# Altium footprint library pre_CONNECTOR.PcbLib: 64 footprints (part 2 of 4)
Each footprint in its own frame and in the unit in brackets; x right, y up, seen from the top. Pads: shape width x height; smd on the part's side, far side on the other; paste and mask are expansions set on the pad; w line width, h text height; cw(c..) or ccw(c..) is an arc to the next point about the centre after c.
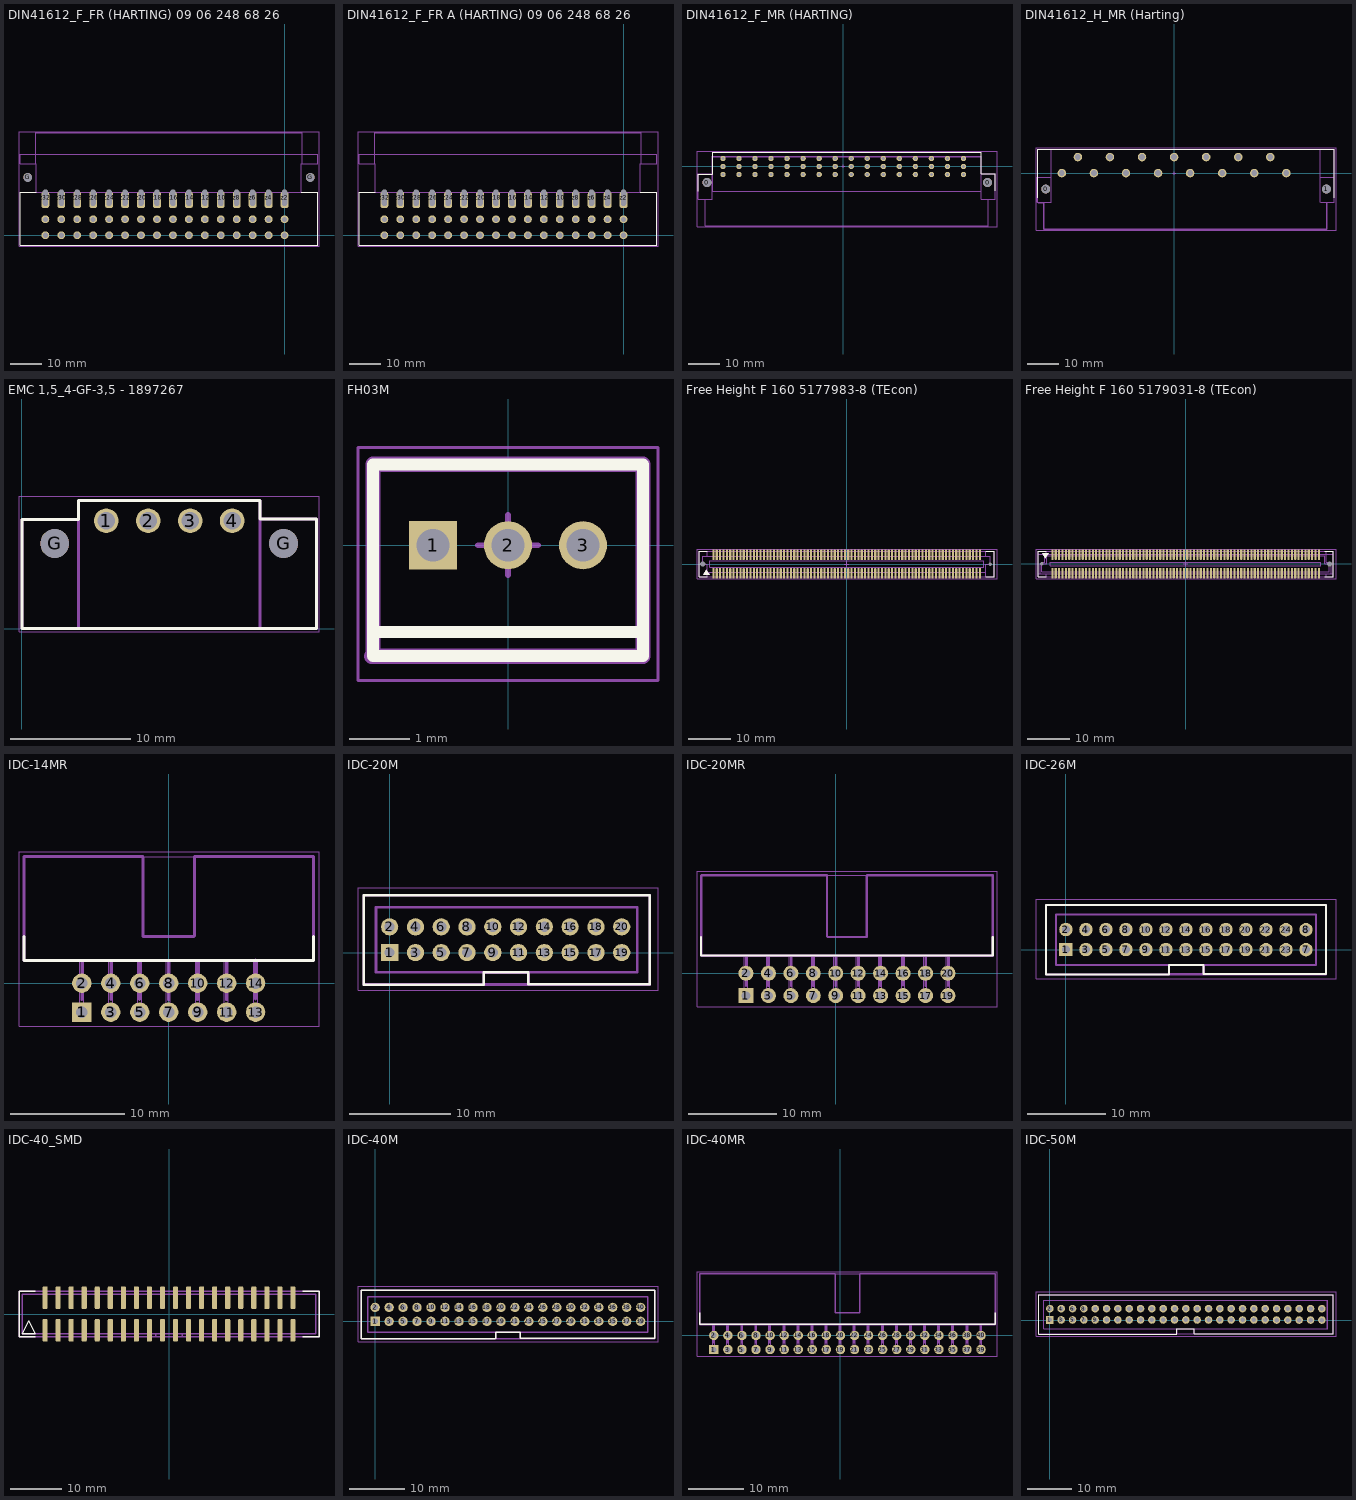
[diagram p1: the footprints below, top view; thin cyan lines are the x and y axes]

## DIN41612_F_FR (HARTING) 09 06 248 68 26 [mm] "Розетка Harting 41612 Тип F"
height 12.7
pads (50):
  round 2.5 hole 1.6: b2(0,5.08) b4(-5.08,5.08) b6(-10.16,5.08) b8(-15.24,5.08) b10(-20.32,5.08) b12(-25.4,5.08) b14(-30.48,5.08) b16(-35.56,5.08) b18(-40.64,5.08) b20(-45.72,5.08) b22(-50.8,5.08) b24(-55.88,5.08) b26(-60.96,5.08) b28(-66.04,5.08) b30(-71.12,5.08) b32(-76.2,5.08) d2(0,0) d4(-5.08,0) d6(-10.16,0) d8(-15.24,0) d10(-20.32,0) d12(-25.4,0) d14(-30.48,0) d16(-35.56,0) d18(-40.64,0) d20(-45.72,0) d22(-50.8,0) d24(-55.88,0) d26(-60.96,0) d28(-66.04,0) d30(-71.12,0) d32(-76.2,0)
  round 2.8 hole 2.8: G(-81.83,18.43) G(8.17,18.43)
  rrect50% 2.5x5.1 hole 1.6 slot 5.17 at 90 deg copper offset 0,-0.7: z2(0,11.945) z4(-5.08,11.945) z6(-10.16,11.945) z8(-15.24,11.945) z10(-20.32,11.945) z12(-25.4,11.945) z14(-30.48,11.945) z16(-35.56,11.945) z18(-40.64,11.945) z20(-45.72,11.945) z22(-50.8,11.945) z24(-55.88,11.945) z26(-60.96,11.945) z28(-66.04,11.945) z30(-71.12,11.945) z32(-76.2,11.945)
Top Overlay:
  lines w0.254: -79.135,13.73 -84.235,13.73 -84.235,-3.145 10.565,-3.145 ; 5.365,13.73 10.565,13.73 10.565,-3.145 ; 10.565,-3.145 10.565,-3.145
Top Assy:
  lines w0.254: -79.28,22.83 -79.28,32.63 5.62,32.63 5.62,22.73 ; -79.28,25.73 -84.23,25.73 -84.23,22.73 -79.38,22.73 -79.13,22.73 -79.13,13.73 5.37,13.73 5.37,22.73 5.62,22.73 ; 5.62,22.73 10.57,22.73 10.57,25.73 5.62,25.73 5.62,22.73
Mechanical 13:
  lines w0.254: -84.231,25.605 -84.231,22.715 -79.132,22.715 -79.132,13.729 5.375,13.729 5.375,22.73 5.62,22.73 ; -84.231,25.73 -79.284,25.73 ; -79.284,22.729 -79.284,25.729 ; -79.28,25.73 5.62,25.73 ; -79.28,25.766 -79.28,32.629 5.62,32.629 5.62,22.73 ; 5.62,23.06 5.62,25.73 ; 5.62,22.73 10.57,22.73 10.57,25.73 5.62,25.73
Mechanical 15:
  lines w0.05: -84.585,-3.52 10.965,-3.52 ; -84.58,-3.52 -84.58,32.98 10.965,32.98 10.965,-3.495
  lines w0.1: -0.5,0.014 0.5,0.014 ; 0,-0.486 0,0.514
3D body: height 14.75, standoff 0, extent -79.138,13.719 5.406,22.743
3D body: height 14.75, standoff 0, extent 5.631,22.701 10.576,25.724
3D body: height 13.57, standoff 1.17, extent -79.135,25.73 5.628,32.505
3D body: height 14.75, standoff 0, extent -84.126,22.713 -79.286,25.725
3D body: height 14.75, standoff 0, extent -79.289,22.745 5.601,25.73

## DIN41612_F_FR A (HARTING) 09 06 248 68 26 [mm] "Розетка Harting 41612 Тип F"
height 12.7
pads (48):
  round 2.5 hole 1.6: b2(-0.009,5.071) b4(-5.089,5.071) b6(-10.169,5.071) b8(-15.249,5.071) b10(-20.329,5.071) b12(-25.409,5.071) b14(-30.489,5.071) b16(-35.569,5.071) b18(-40.649,5.071) b20(-45.729,5.071) b22(-50.809,5.071) b24(-55.889,5.071) b26(-60.969,5.071) b28(-66.049,5.071) b30(-71.129,5.071) b32(-76.209,5.071) d2(-0.009,-0.009) d4(-5.089,-0.009) d6(-10.169,-0.009) d8(-15.249,-0.009) d10(-20.329,-0.009) d12(-25.409,-0.009) d14(-30.489,-0.009) d16(-35.569,-0.009) d18(-40.649,-0.009) d20(-45.729,-0.009) d22(-50.809,-0.009) d24(-55.889,-0.009) d26(-60.969,-0.009) d28(-66.049,-0.009) d30(-71.129,-0.009) d32(-76.209,-0.009)
  rrect50% 2.5x5.1 hole 1.6 slot 5.17 at 90 deg copper offset 0,-0.7: z2(-0.009,11.936) z4(-5.089,11.936) z6(-10.169,11.936) z8(-15.249,11.936) z10(-20.329,11.936) z12(-25.409,11.936) z14(-30.489,11.936) z16(-35.569,11.936) z18(-40.649,11.936) z20(-45.729,11.936) z22(-50.809,11.936) z24(-55.889,11.936) z26(-60.969,11.936) z28(-66.049,11.936) z30(-71.129,11.936) z32(-76.209,11.936)
Top Overlay:
  lines w0.254: -79.144,13.721 -84.244,13.721 -84.244,-3.154 10.556,-3.154 ; 5.356,13.721 10.556,13.721 10.556,-3.154 ; 10.556,-3.154 10.556,-3.154
Top Assy:
  lines w0.254: -79.289,22.821 -79.289,32.621 5.611,32.621 5.611,22.721 ; -79.289,25.721 -84.239,25.721 -84.239,22.721 -79.389,22.721 -79.139,22.721 -79.139,13.721 5.361,13.721 5.361,22.721 5.611,22.721 ; 5.611,22.721 5.611,25.721 10.561,25.721 10.561,22.721 5.611,22.721
Mechanical 13:
  lines w0.254: -84.24,25.596 -84.24,22.706 -79.141,22.706 -79.141,13.72 5.366,13.72 5.366,22.721 5.611,22.721 ; -84.24,25.721 -79.293,25.721 ; -79.293,22.721 -79.293,25.72 ; -79.289,25.721 5.611,25.721 ; -79.289,25.757 -79.289,32.62 5.611,32.62 5.611,22.721 ; 5.611,23.051 5.611,25.721 ; 5.611,22.721 10.561,22.721 10.561,25.721 5.611,25.721
Mechanical 15:
  lines w0.05: -84.594,-3.529 10.956,-3.529 ; -84.589,-3.529 -84.589,32.971 10.956,32.971 10.956,-3.504
  lines w0.1: -0.509,0.005 0.491,0.005 ; -0.009,-0.495 -0.009,0.505
3D body: height 14.75, standoff 0, extent -79.298,22.736 5.592,25.721
3D body: height 14.75, standoff 0, extent -84.135,22.704 -79.295,25.716
3D body: height 13.57, standoff 1.17, extent -79.144,25.721 5.619,32.496
3D body: height 14.75, standoff 0, extent 5.622,22.692 10.567,25.715
3D body: height 14.75, standoff 0, extent -79.147,13.71 5.397,22.734

## DIN41612_F_MR (HARTING) [mm]
height 12.7
pads (50):
  round 2.8 hole 2.8 unplated: 0(-43.18,-5.08) 0(45.72,-5.08)
  round 1.7 hole 1: b2(38.1,0) b4(33.02,0) b6(27.94,0) b8(22.86,0) b10(17.78,0) b12(12.7,0) b14(7.62,0) b16(2.54,0) b18(-2.54,0) b20(-7.62,0) b22(-12.7,0) b24(-17.78,0) b26(-22.86,0) b28(-27.94,0) b30(-33.02,0) b32(-38.1,0) d2(38.1,2.54) d4(33.02,2.54) d6(27.94,2.54) d8(22.86,2.54) d10(17.78,2.54) d12(12.7,2.54) d14(7.62,2.54) d16(2.54,2.54) d18(-2.54,2.54) d20(-7.62,2.54) d22(-12.7,2.54) d24(-17.78,2.54) d26(-22.86,2.54) d28(-27.94,2.54) d30(-33.02,2.54) d32(-38.1,2.54) z2(38.1,-2.54) z4(33.02,-2.54) z6(27.94,-2.54) z8(22.86,-2.54) z10(17.78,-2.54) z12(12.7,-2.54) z14(7.62,-2.54) z16(2.54,-2.54) z18(-2.54,-2.54) z20(-7.62,-2.54) z22(-12.7,-2.54) z24(-17.78,-2.54) z26(-22.86,-2.54) z28(-27.94,-2.54) z30(-33.02,-2.54) z32(-38.1,-2.54)
Top Overlay:
  lines w0.254: -45.9,-7.8 -45.9,-2.4 -41.425,-2.4 ; -41.375,-2.4 -41.375,4.5 ; -41.35,4.5 -31.7,4.5 43.725,4.5 ; 43.725,-2.3 48.075,-2.3 ; 43.725,-2.275 43.725,4.475 ; 48.2,-7.7 48.2,-2.325
Top Assy:
  lines w0.254: -43.75,-10.45 -43.75,-18.78 43.75,-18.78 45.92,-18.78 45.92,-10.42 45.9,-10.4 ; -41.5,-7.94 -41.5,-10.4 -45.9,-10.4 -45.9,-2.4 -41.4,-2.4 ; 43.765,-2.3 48.2,-2.3 48.2,-10.4 43.8,-10.4 43.8,-9.775 43.8,-8.525 43.8,-7.9 ; -41.4,-7.84 42.1,-7.84 43.74,-7.84 43.75,-7.85 43.75,3.22 -41.4,3.22 -41.4,-7.84
Mechanical 13:
  lines w0.1: -45.9,-10.363 -45.9,-2.375 -41.487,-2.375 ; -45.888,-10.375 -43.713,-10.375 ; -43.725,-10.425 -43.725,-18.775 45.875,-18.775 45.875,-10.375 ; -43.7,-10.375 -41.525,-10.375 ; -41.45,-10.375 -41.45,3.2 ; -41.45,3.15 43.775,3.15 ; 43.75,-10.375 43.75,3.2 ; 43.787,-2.375 48.2,-2.375 48.2,-10.363 ; 43.825,-10.375 46,-10.375 ; 46.013,-10.375 48.188,-10.375
Mechanical 15:
  lines w0.05: -46.325,-19.15 -46.325,4.875 48.725,4.875 48.725,-19.15 -46.325,-19.15
  lines w0.1: -0.5,0.025 0.5,0.025 ; 0,-0.475 0,0.525
3D body: height 9.7, standoff 0, extent -41.4,-7.75 43.731,3.2
3D body: height 6, standoff 0, extent 43.794,-10.4 48.256,-2.4
3D body: height 6, standoff 0, extent -45.9,-10.375 -41.438,-2.375
3D body: height 9.7, standoff -3, extent -43.725,-18.775 45.875,-7.725

## DIN41612_H_MR (Harting) [mm]
height 14.8
pads (17):
  round 2.8 hole 2.8: 0(-40.64,-5.08) 1(48.26,-5.08)
  round 2.7 hole 1.8: d6(30.48,5.08) d10(20.32,5.08) d14(10.16,5.08) d18(0,5.08) d22(-10.16,5.08) d26(-20.32,5.08) d30(-30.48,5.08) z4(35.56,0) z8(25.4,0) z12(15.24,0) z16(5.08,0) z20(-5.08,0) z24(-15.24,0) z28(-25.4,0) z32(-35.56,0)
Top Overlay:
  lines w0.254: -43.18,-7.84 -43.18,7.62 50.8,7.62 50.8,-7.84
Top Assy:
  lines w0.254: -43.18,-9.27 -43.18,-7.84 -43.18,7.62 50.8,7.62 50.8,-9.305 48.42,-9.305 48.42,-17.78 -41.22,-17.78 -41.22,-9.375 -43.075,-9.375 -43.18,-9.27
Mechanical 13:
  lines w0.1: -43.325,-9.288 -43.325,-1.3 -38.912,-1.3 ; -43.312,-9.3 -41.137,-9.3 ; -41.15,-9.35 -41.15,-17.7 48.45,-17.7 48.45,-9.3 ; -41.125,-9.3 -38.95,-9.3 ; -38.875,-9.3 -38.875,7.6 46.325,7.6 46.325,-9.3 ; 46.363,-1.3 50.775,-1.3 50.775,-9.288 ; 46.4,-9.3 48.575,-9.3 ; 48.588,-9.3 50.763,-9.3
Mechanical 15:
  lines w0.05: -43.75,-18.075 51.3,-18.075 51.3,7.975 -43.75,7.975 -43.75,-18.075
  lines w0.1: -0.475,0 0.525,0 ; 0.025,-0.525 0.025,0.475
3D body: height 9.7, standoff -3, extent -41.15,-17.7 48.45,-6.65
3D body: height 6, standoff 0, extent -43.325,-9.3 -38.863,-1.3
3D body: height 6, standoff 0, extent 46.369,-9.325 50.831,-1.325
3D body: height 9.7, standoff 0, extent -38.825,-6.675 46.306,7.625

## EMC 1,5_4-GF-3,5 - 1897267 [mm] "Клемма Base strip - EMC 1,5_4-GF-3,5 - 1897267 Phoenix Contact"
height 7
pads (6):
  round 2.05 hole 1.45: 1(7.025,9) 2(10.525,9) 3(14.025,9) 4(17.525,9)
  round 2.4 hole 2.4: G(2.725,7.1) G(21.825,7.1)
Top Overlay:
  lines w0.254: 0,0 0,9.1 4.7,9.1 4.7,10.7 19.85,10.7 19.85,9.125 24.55,9.125 24.55,0 0,0
Top Assy:
  lines w0.254: 0,9.075 0,0 24.55,0 24.55,9.125 19.875,9.125 19.85,9.15 19.85,10.7 4.7,10.7 4.7,9.1 0,9.1
Mechanical 13:
  lines w0.254: 4.7,0 19.85,0 ; 4.7,0 4.7,10.7 19.85,10.7 19.85,0 ; 4.7,0 0,0 0,9.1 4.7,9.1 4.7,0 ; 19.85,0 19.85,9.125 24.55,9.125 24.55,0 19.85,0
Mechanical 15:
  lines w0.05: -0.25,-0.25 24.775,-0.25 24.775,11.025 -0.25,11.025 -0.25,-0.25
  lines w0.1: 6.525,9 7.525,9 ; 7.025,8.5 7.025,9.5
3D body: height 6, standoff 0, extent 19.8,0 24.556,9.125
3D body: height 6, standoff 0, extent 0,0 4.753,9
3D body: height 7, standoff 0, extent 4.7,0 19.857,10.7

## FH03M [mm]
pads (3):
  rect 0.8x0.8 hole 0.55: 1(-1.25,0)
  round 0.8 hole 0.55: 2(0,0) 3(1.25,0)
Top Overlay:
  lines w0.2: -2.25,-1.45 2.25,-1.45 ; -2.25,-1.85 2.25,-1.85 2.25,1.35 -2.25,1.35 -2.25,-1.85
Top Assy:
  lines w0.254: -2.275,-1.85 2.25,-1.85 2.25,1.35 -2.25,1.35 -2.25,-1.85
Mechanical 13:
  lines w0.1: -2.25,-1.85 2.25,-1.85 2.25,1.35 -2.25,1.35 -2.25,-1.85
Mechanical 15:
  lines w0.05: -2.5,-2.25 -2.5,1.625 2.5,1.625 2.5,-2.25 -2.5,-2.25
  lines w0.1: -0.5,0 0.5,0 ; 0,-0.5 0,0.5
3D body: height 4.2, standoff 0, extent -2.325,-1.9 2.3,1.4

## Free Height F 160 5177983-8 (TEcon) [mm]
height 3.75
pads (162):
  round 0 hole 1.23 unplated mask+0.7: 0(-34.1,0)
  round 0 hole 0.83 unplated mask+0.5: 0(34.1,0)
  rect 0.5x2.5 smd: 1(-31.6,-2.2)
  rrect50% 0.5x2.5 smd: 2(-31.6,2.2) 3(-30.8,-2.2) 4(-30.8,2.2) 5(-30,-2.2) 6(-30,2.2) 7(-29.2,-2.2) 8(-29.2,2.2) 9(-28.4,-2.2) 10(-28.4,2.2) 11(-27.6,-2.2) 12(-27.6,2.2) 13(-26.8,-2.2) 14(-26.8,2.2) 15(-26,-2.2) 16(-26,2.2) 17(-25.2,-2.2) 18(-25.2,2.2) 19(-24.4,-2.2) 20(-24.4,2.2) 21(-23.6,-2.2) 22(-23.6,2.2) 23(-22.8,-2.2) 24(-22.8,2.2) 25(-22,-2.2) 26(-22,2.2) 27(-21.2,-2.2) 28(-21.2,2.2) 29(-20.4,-2.2) 30(-20.4,2.2) 31(-19.6,-2.2) 32(-19.6,2.2) 33(-18.8,-2.2) 34(-18.8,2.2) 35(-18,-2.2) 36(-18,2.2) 37(-17.2,-2.2) 38(-17.2,2.2) 39(-16.4,-2.2) 40(-16.4,2.2) 41(-15.6,-2.2) 42(-15.6,2.2) 43(-14.8,-2.2) 44(-14.8,2.2) 45(-14,-2.2) 46(-14,2.2) 47(-13.2,-2.2) 48(-13.2,2.2) 49(-12.4,-2.2) 50(-12.4,2.2) 51(-11.6,-2.2) 52(-11.6,2.2) 53(-10.8,-2.2) 54(-10.8,2.2) 55(-10,-2.2) 56(-10,2.2) 57(-9.2,-2.2) 58(-9.2,2.2) 59(-8.4,-2.2) 60(-8.4,2.2) 61(-7.6,-2.2) 62(-7.6,2.2) 63(-6.8,-2.2) 64(-6.8,2.2) 65(-6,-2.2) 66(-6,2.2) 67(-5.2,-2.2) 68(-5.2,2.2) 69(-4.4,-2.2) 70(-4.4,2.2) 71(-3.6,-2.2) 72(-3.6,2.2) 73(-2.8,-2.2) 74(-2.8,2.2) 75(-2,-2.2) 76(-2,2.2) 77(-1.2,-2.2) 78(-1.2,2.2) 79(-0.4,-2.2) 80(-0.4,2.2) 81(0.4,-2.2) 82(0.4,2.2) 83(1.2,-2.2) 84(1.2,2.2) 85(2,-2.2) 86(2,2.2) 87(2.8,-2.2) 88(2.8,2.2) 89(3.6,-2.2) 90(3.6,2.2) 91(4.4,-2.2) 92(4.4,2.2) 93(5.2,-2.2) 94(5.2,2.2) 95(6,-2.2) 96(6,2.2) 97(6.8,-2.2) 98(6.8,2.2) 99(7.6,-2.2) 100(7.6,2.2) 101(8.4,-2.2) 102(8.4,2.2) 103(9.2,-2.2) 104(9.2,2.2) 105(10,-2.2) 106(10,2.2) 107(10.8,-2.2) 108(10.8,2.2) 109(11.6,-2.2) 110(11.6,2.2) 111(12.4,-2.2) 112(12.4,2.2) 113(13.2,-2.2) 114(13.2,2.2) 115(14,-2.2) 116(14,2.2) 117(14.8,-2.2) 118(14.8,2.2) 119(15.6,-2.2) 120(15.6,2.2) 121(16.4,-2.2) 122(16.4,2.2) 123(17.2,-2.2) 124(17.2,2.2) 125(18,-2.2) 126(18,2.2) 127(18.8,-2.2) 128(18.8,2.2) 129(19.6,-2.2) 130(19.6,2.2) 131(20.4,-2.2) 132(20.4,2.2) 133(21.2,-2.2) 134(21.2,2.2) 135(22,-2.2) 136(22,2.2) 137(22.8,-2.2) 138(22.8,2.2) 139(23.6,-2.2) 140(23.6,2.2) 141(24.4,-2.2) 142(24.4,2.2) 143(25.2,-2.2) 144(25.2,2.2) 145(26,-2.2) 146(26,2.2) 147(26.8,-2.2) 148(26.8,2.2) 149(27.6,-2.2) 150(27.6,2.2) 151(28.4,-2.2) 152(28.4,2.2) 153(29.2,-2.2) 154(29.2,2.2) 155(30,-2.2) 156(30,2.2) 157(30.8,-2.2) 158(30.8,2.2) 159(31.6,-2.2) 160(31.6,2.2)
Top Overlay:
  region: -34.05,-2.525 -32.45,-2.525 -33.25,-1.325
  lines w0.254: -33,-3 -35,-3 -35,3 -33,3 ; 32.988,-3 34.988,-3 ; 33,3 35,3 35,-2.975
Top Assy:
  region: -34.05,-2.525 -32.45,-2.525 -33.25,-1.325
  lines w0.254: -34.1,1.85 -34.1,0 -33,0 -33,-3 -35,-3 -35,3 -33,3 ; -34.1,1.9 34.1,1.9 ; -33,-1.9 33,-1.9 33,0 34.1,0 ; -33,1.9 -33,2.975 ; 33,-1.875 33,-3 34.975,-3 ; 33,1.9 33,3 35,3 35,-2.975 ; 34.1,-0.025 34.1,1.825 ; -32.5,-0.8 32.5,-0.8 32.5,0.8 -32.5,0.8 -32.5,-0.8
Mechanical 13:
  lines w0.2: -33,-3.025 -33,-1.9 ; -33,1.9 -33,3 ; 33,-3.025 33,-1.9 ; 33,1.9 33,3 ; -33,-1.9 -33,0 -34.1,0 -34.1,1.9 34.1,1.9 34.1,0 33,0 33,-1.9 ; -33,-1.9 33,-1.9 ; -35,-3 -35,3.025 35,3.025 35,-3 -35,-3 ; -32.5,-0.8 -32.5,0.8 32.5,0.8 32.5,-0.8 -32.5,-0.8
Mechanical 15:
  lines w0.05: -35.475,-3.525 -35.475,3.575 35.675,3.575 35.675,-3.525 -35.475,-3.525
  lines w0.1: -0.5,0 0.5,0 ; 0,-0.5 0,0.5
3D body: height 1.2, standoff 0, extent -35.05,-3.025 35,3
3D body: height 3.75, standoff 0, extent -34.1,-0.025 34.112,1.925
3D body: height 3.75, standoff 0, extent -33,-1.9 33.012,-0.025

## Free Height F 160 5179031-8 (TEcon) [mm]
height 7.6
pads (162):
  round 0 hole 0.83 unplated mask+0.5: 0(-34.1,0)
  round 0 hole 1.23 unplated mask+0.7: 0(34.1,0)
  rect 0.5x2.5 smd: 1(-31.6,2.2)
  rrect50% 0.5x2.5 smd: 2(-31.6,-2.2) 3(-30.8,2.2) 4(-30.8,-2.2) 5(-30,2.2) 6(-30,-2.2) 7(-29.2,2.2) 8(-29.2,-2.2) 9(-28.4,2.2) 10(-28.4,-2.2) 11(-27.6,2.2) 12(-27.6,-2.2) 13(-26.8,2.2) 14(-26.8,-2.2) 15(-26,2.2) 16(-26,-2.2) 17(-25.2,2.2) 18(-25.2,-2.2) 19(-24.4,2.2) 20(-24.4,-2.2) 21(-23.6,2.2) 22(-23.6,-2.2) 23(-22.8,2.2) 24(-22.8,-2.2) 25(-22,2.2) 26(-22,-2.2) 27(-21.2,2.2) 28(-21.2,-2.2) 29(-20.4,2.2) 30(-20.4,-2.2) 31(-19.6,2.2) 32(-19.6,-2.2) 33(-18.8,2.2) 34(-18.8,-2.2) 35(-18,2.2) 36(-18,-2.2) 37(-17.2,2.2) 38(-17.2,-2.2) 39(-16.4,2.2) 40(-16.4,-2.2) 41(-15.6,2.2) 42(-15.6,-2.2) 43(-14.8,2.2) 44(-14.8,-2.2) 45(-14,2.2) 46(-14,-2.2) 47(-13.2,2.2) 48(-13.2,-2.2) 49(-12.4,2.2) 50(-12.4,-2.2) 51(-11.6,2.2) 52(-11.6,-2.2) 53(-10.8,2.2) 54(-10.8,-2.2) 55(-10,2.2) 56(-10,-2.2) 57(-9.2,2.2) 58(-9.2,-2.2) 59(-8.4,2.2) 60(-8.4,-2.2) 61(-7.6,2.2) 62(-7.6,-2.2) 63(-6.8,2.2) 64(-6.8,-2.2) 65(-6,2.2) 66(-6,-2.2) 67(-5.2,2.2) 68(-5.2,-2.2) 69(-4.4,2.2) 70(-4.4,-2.2) 71(-3.6,2.2) 72(-3.6,-2.2) 73(-2.8,2.2) 74(-2.8,-2.2) 75(-2,2.2) 76(-2,-2.2) 77(-1.2,2.2) 78(-1.2,-2.2) 79(-0.4,2.2) 80(-0.4,-2.2) 81(0.4,2.2) 82(0.4,-2.2) 83(1.2,2.2) 84(1.2,-2.2) 85(2,2.2) 86(2,-2.2) 87(2.8,2.2) 88(2.8,-2.2) 89(3.6,2.2) 90(3.6,-2.2) 91(4.4,2.2) 92(4.4,-2.2) 93(5.2,2.2) 94(5.2,-2.2) 95(6,2.2) 96(6,-2.2) 97(6.8,2.2) 98(6.8,-2.2) 99(7.6,2.2) 100(7.6,-2.2) 101(8.4,2.2) 102(8.4,-2.2) 103(9.2,2.2) 104(9.2,-2.2) 105(10,2.2) 106(10,-2.2) 107(10.8,2.2) 108(10.8,-2.2) 109(11.6,2.2) 110(11.6,-2.2) 111(12.4,2.2) 112(12.4,-2.2) 113(13.2,2.2) 114(13.2,-2.2) 115(14,2.2) 116(14,-2.2) 117(14.8,2.2) 118(14.8,-2.2) 119(15.6,2.2) 120(15.6,-2.2) 121(16.4,2.2) 122(16.4,-2.2) 123(17.2,2.2) 124(17.2,-2.2) 125(18,2.2) 126(18,-2.2) 127(18.8,2.2) 128(18.8,-2.2) 129(19.6,2.2) 130(19.6,-2.2) 131(20.4,2.2) 132(20.4,-2.2) 133(21.2,2.2) 134(21.2,-2.2) 135(22,2.2) 136(22,-2.2) 137(22.8,2.2) 138(22.8,-2.2) 139(23.6,2.2) 140(23.6,-2.2) 141(24.4,2.2) 142(24.4,-2.2) 143(25.2,2.2) 144(25.2,-2.2) 145(26,2.2) 146(26,-2.2) 147(26.8,2.2) 148(26.8,-2.2) 149(27.6,2.2) 150(27.6,-2.2) 151(28.4,2.2) 152(28.4,-2.2) 153(29.2,2.2) 154(29.2,-2.2) 155(30,2.2) 156(30,-2.2) 157(30.8,2.2) 158(30.8,-2.2) 159(31.6,2.2) 160(31.6,-2.2)
Top Overlay:
  region: -34.05,2.525 -32.45,2.525 -33.25,1.325
  lines w0.254: -33,-3 -35,-3 -35,3 -33,3 ; 33,-3 35,-3 35,2.975 34.975,3 33,3
Top Assy:
  region: -34.05,2.525 -32.45,2.525 -33.25,1.325
  lines w0.254: -35,2.275 -33.025,2.275 -33.025,3 ; -34.975,-2.3 34.5,-2.3 34.5,0.025 ; -34.5,-2.3 -34.5,0 ; -34.1,0.4 -33.4,0.4 -33.4,2.3 ; -33.025,2.3 33.4,2.3 ; -33,-3 -35,-3 -35,3 -33,3 ; -33,-2.975 -33,-2.3 ; 33,-3 35,-3 35,2.975 ; 33,3 34.975,3 ; 33.3,2.3 34.975,2.3 ; 33.4,-3 33.4,-2.3 ; 33.4,1.875 33.4,3 ; 33.4,1.9 33.4,0.4 34.475,0.4 ; 33.475,-2.3 34.975,-2.3 ; 34.075,-1.9 -34.1,-1.9 -34.1,0 -32.975,0 -32.975,1.875 -32.95,1.9 33,1.9 33,0.025 34.1,0.025 ; 34.1,-1.9 34.1,0 ; -32.1,-0.4 32.1,-0.4 32.1,0.4 -32.1,0.4 -32.1,-0.4
Mechanical 13:
  lines w0.2: -35,-2.325 -34.5,-2.325 ; -35,2.3 -33.025,2.3 ; -34.5,0 -34.5,-2.325 ; -34.1,0.4 -33.4,0.4 -33.4,2.3 ; -33.025,3.025 -33.025,2.3 ; -33,-3 -33,-2.325 ; -32.975,0 -34.1,0 -34.1,-1.85 -34.075,-1.875 34.1,-1.875 34.1,0.025 33,0.025 33,1.9 -32.975,1.9 -32.975,0.025 ; 33.275,2.3 35.025,2.3 ; 33.4,-3 33.4,-2.325 ; 33.4,2.3 -33.025,2.3 ; 33.4,3.025 33.4,1.9 33.4,0.4 34.5,0.4 ; 34,-2.325 35,-2.325 ; 34.5,0 34.5,-2.325 -34.5,-2.325 ; -35,-3.025 -35,3 35,3 35,-3.025 -35,-3.025 ; -32.1,-0.4 -32.1,0.4 32.1,0.4 32.1,-0.4 -32.1,-0.4
Mechanical 15:
  lines w0.05: -35.475,-3.575 -35.475,3.525 35.675,3.525 35.675,-3.575 -35.475,-3.575
  lines w0.1: -0.5,0 0.5,0 ; 0,-0.5 0,0.5
3D body: height 4.6, standoff 0, extent -35,-3.037 35.05,2.988
3D body: height 7.6, standoff 0, extent -34.5,-2.325 34.525,2.35
3D body: height 6, standoff 0, extent -32.095,-0.4 32.077,0.4

## IDC-14MR [mm]
height 8.75
pads (14):
  rect 1.7x1.7 hole 1: 1(-7.62,-2.54)
  round 1.7 hole 1: 2(-7.62,0) 3(-5.08,-2.54) 4(-5.08,0) 5(-2.54,-2.54) 6(-2.54,0) 7(0,-2.54) 8(0,0) 9(2.54,-2.54) 10(2.54,0) 11(5.08,-2.54) 12(5.08,0) 13(7.62,-2.54) 14(7.62,0)
Top Overlay:
  lines w0.254: -12.7,4.1 -12.7,2 0,2 12.7,2 12.7,4.1
Top Assy:
  lines w0.254: -7.625,-1.425 -7.625,2 ; -5.075,-1.425 -5.075,1.95 ; -2.55,-1.425 -2.55,1.975 ; -0.025,-1.45 -0.025,1.975 ; 2.525,-1.45 2.525,1.925 ; 5.05,-1.45 5.05,1.95 ; 7.625,-1.4 7.625,2.025 ; -12.7,2 -12.7,11.075 -12.675,11.1 -2.275,11.1 -2.25,11.075 -2.25,4.1 2.225,4.1 2.25,4.125 2.25,11.1 12.7,11.1 12.7,2 -12.7,2
Mechanical 13:
  lines w0.1: -7.8,2.025 -7.8,-2.54 -7.45,-2.54 -7.45,2.025 ; -5.25,2.057 -5.25,-2.485 -4.9,-2.475 -4.9,2.057 ; -2.725,-2.508 -2.725,2.057 ; -2.72,-2.54 -2.37,-2.54 ; -2.375,-2.508 -2.375,2.057 ; -0.2,-2.508 -0.2,2.057 ; -0.18,-2.54 0.17,-2.54 ; 0.15,-2.508 0.15,2.057 ; 2.35,-2.533 2.35,2.033 ; 2.36,-2.54 2.71,-2.54 ; 2.7,-2.533 2.7,2.033 ; 4.875,-2.533 4.875,2.033 ; 5.225,-2.533 5.225,2.033 ; 7.44,-2.54 7.79,-2.54 ; 7.45,-2.533 7.45,2.033 ; 7.8,-2.533 7.8,2.033 ; -12.7,1.95 -12.7,11.1 12.675,11.1 12.675,1.95 -12.7,1.95 ; 4.9,-2.54 5.25,-2.54 4.9,-2.54
Mechanical 15:
  lines w0.05: -13.125,-3.775 13.175,-3.775 13.175,11.525 -13.125,11.525 -13.125,-3.775
  lines w0.1: -0.5,0 0.5,0 ; 0,-0.5 0,0.5
3D body: height 5.8, standoff 0, extent 7.424,-2.54 7.8,2.075
3D body: height 5.8, standoff 0, extent 4.849,-2.54 5.225,2.075
3D body: height 5.8, standoff 0, extent 2.324,-2.54 2.7,2.075
3D body: height 5.8, standoff 0, extent -0.226,-2.54 0.15,2.075
3D body: height 5.8, standoff 0, extent -2.751,-2.54 -2.375,2.075
3D body: height 5.8, standoff 0, extent -5.276,-2.54 -4.9,2.075
3D body: height 5.8, standoff 0, extent -7.826,-2.54 -7.45,2.075
3D body: height 9, standoff 0, extent -12.725,2.025 12.675,11.125

## IDC-20M [mm]
height 9.05
pads (20):
  rect 1.7x1.7 hole 1: 1(-0.01,0.01)
  round 1.7 hole 1: 2(-0.01,2.55) 3(2.53,0.01) 4(2.53,2.55) 5(5.07,0.01) 6(5.07,2.55) 7(7.61,0.01) 8(7.61,2.55) 9(10.15,0.01) 10(10.15,2.55) 11(12.69,0.01) 12(12.69,2.55) 13(15.23,0.01) 14(15.23,2.55) 15(17.77,0.01) 16(17.77,2.55) 17(20.31,0.01) 18(20.31,2.55) 19(22.85,0.01) 20(22.85,2.55)
Top Overlay:
  lines w0.254: -2.55,-3.15 9.275,-3.15 9.275,-1.925 13.65,-1.925 13.65,-3.1 25.6,-3.1 25.6,5.675 22.995,5.675 -2.55,5.675 -2.55,-3.15
Top Assy:
  lines w0.254: -2.55,-3.13 21.85,-3.13 ; -2.55,-3.125 -2.55,5.675 ; -2.55,5.67 25.6,5.67 25.6,-3.13 13.725,-3.13 ; 9.25,-1.93 -1.35,-1.93 -1.35,4.47 24.4,4.47 24.4,-1.93 13.65,-1.93 ; 9.25,-3.125 9.25,-1.95 13.7,-1.95 13.7,-3.125 9.25,-3.125
Mechanical 13:
  lines w0.1: -2.55,5.67 25.65,5.67 25.65,-3.125 -2.55,-3.125 -2.55,5.675 ; -2.55,5.7 25.625,5.7 ; 9.3,-3.2 9.3,-2 ; 13.65,-3.2 13.65,-2.025 ; -1.35,-1.95 24.45,-1.95 24.45,4.475 -1.35,4.475 -1.35,-1.95
Mechanical 15:
  lines w0.05: -3.125,-3.675 26.425,-3.675 26.425,6.375 -3.125,6.375 -3.125,-3.675
  lines w0.1: 9.65,2.55 10.65,2.55 ; 22.35,2.55 23.35,2.55
3D body: height 8.8, standoff 0.25, extent 13.6,-3.145 25.6,-1.895
3D body: height 8.8, standoff 0.25, extent 24.42,-2.981 25.67,5.72
3D body: height 8.8, standoff 0.25, extent -2.611,-3.081 -1.361,5.65
3D body: height 8.8, standoff 0.25, extent -2.531,-3.12 9.275,-1.87
3D body: height 8.8, standoff 0.25, extent -2.506,4.475 25.625,5.725
3D body: height 2.8, standoff 0, extent -2.556,-3.125 25.65,5.7

## IDC-20MR [mm]
height 8.75
pads (20):
  rect 1.7x1.7 hole 1: 1(-10.16,-2.54)
  round 1.7 hole 1: 2(-10.16,0) 3(-7.62,-2.54) 4(-7.62,0) 5(-5.08,-2.54) 6(-5.08,0) 7(-2.54,-2.54) 8(-2.54,0) 9(0,-2.54) 10(0,0) 11(2.54,-2.54) 12(2.54,0) 13(5.08,-2.54) 14(5.08,0) 15(7.62,-2.54) 16(7.62,0) 17(10.16,-2.54) 18(10.16,0) 19(12.7,-2.54) 20(12.7,0)
Top Overlay:
  lines w0.254: -15.24,4.1 -15.24,2 1.27,2 17.78,2 17.78,4.1
Top Assy:
  lines w0.254: -10.15,-1.425 -10.15,2 ; -7.625,-1.425 -7.625,2 ; -5.075,-1.425 -5.075,1.95 ; -2.55,-1.425 -2.55,1.975 ; -0.025,-1.45 -0.025,1.975 ; 2.525,-1.45 2.525,1.925 ; 5.05,-1.45 5.05,1.95 ; 7.625,-1.4 7.625,2.025 ; 10.15,-1.45 10.15,1.975 ; 12.7,-1.425 12.7,2 ; -15.225,2 17.775,2 17.775,11.1 3.525,11.1 3.5,11.075 3.5,4.1 -0.9,4.1 -0.975,4.175 -0.975,11.075 -1,11.1 -15.2,11.1 -15.225,11.075 -15.225,2
Mechanical 13:
  lines w0.1: -10.325,2.025 -10.325,-2.54 -9.975,-2.54 -9.975,2.025 ; -7.8,2.025 -7.8,-2.54 -7.45,-2.54 -7.45,2.025 ; -5.25,2.057 -5.25,-2.485 -4.9,-2.475 -4.9,2.057 ; -2.725,-2.508 -2.725,2.057 ; -2.72,-2.54 -2.37,-2.54 ; -2.375,-2.508 -2.375,2.057 ; -0.2,-2.508 -0.2,2.057 ; -0.18,-2.54 0.17,-2.54 ; 0.15,-2.508 0.15,2.057 ; 2.35,-2.533 2.35,2.033 ; 2.36,-2.54 2.71,-2.54 ; 2.7,-2.533 2.7,2.033 ; 4.875,-2.533 4.875,2.033 ; 4.9,-2.54 5.25,-2.54 ; 5.225,-2.533 5.225,2.033 ; 7.44,-2.54 7.79,-2.54 ; 7.45,-2.533 7.45,2.033 ; 7.8,-2.533 7.8,2.033 ; 9.975,2 9.975,-2.565 10.325,-2.565 10.325,2 ; 12.525,2.025 12.525,-2.54 12.875,-2.54 12.875,2.025 ; -15.2,1.95 17.8,1.95 17.8,11.1 -15.2,11.1 -15.2,1.95
Mechanical 15:
  lines w0.05: -15.7,-3.775 -15.7,11.525 18.25,11.525 18.25,-3.775 -15.7,-3.775
  lines w0.1: -0.5,0 0.5,0 ; 0,-0.5 0,0.5
3D body: height 9, standoff 0, extent -15.228,2.025 17.75,11.125
3D body: height 5.8, standoff 0, extent -7.826,-2.54 -7.45,2.075
3D body: height 5.8, standoff 0, extent -5.276,-2.54 -4.9,2.075
3D body: height 5.8, standoff 0, extent -2.751,-2.54 -2.375,2.075
3D body: height 5.8, standoff 0, extent -0.226,-2.54 0.15,2.075
3D body: height 5.8, standoff 0, extent 2.324,-2.54 2.7,2.075
3D body: height 5.8, standoff 0, extent 4.849,-2.54 5.225,2.075
3D body: height 5.8, standoff 0, extent 7.424,-2.54 7.8,2.075
3D body: height 5.8, standoff 0, extent -10.351,-2.54 -9.975,2.075
3D body: height 5.8, standoff 0, extent 9.949,-2.565 10.325,2.05
3D body: height 5.8, standoff 0, extent 12.499,-2.54 12.875,2.075

## IDC-26M [mm]
height 9.05
pads (26):
  rect 1.7x1.7 hole 1: 1(0,0)
  round 1.7 hole 1: 2(0,2.54) 3(2.54,0) 4(2.54,2.54) 5(5.08,0) 6(5.08,2.54) 7(7.62,0) 7(30.49,-0.01) 8(7.62,2.54) 8(30.49,2.53) 9(10.16,0) 10(10.16,2.54) 11(12.7,0) 12(12.7,2.54) 13(15.24,0) 14(15.24,2.54) 15(17.78,0) 16(17.78,2.54) 17(20.32,0) 18(20.32,2.54) 19(22.86,0) 20(22.86,2.54) 21(25.41,-0.01) 22(25.41,2.53) 23(27.95,-0.01) 24(27.95,2.53)
Top Overlay:
  lines w0.254: -2.53,-3.16 -2.53,5.665 26.815,5.665 33.03,5.665 33.03,-3.11 17.47,-3.11 17.47,-1.935 13.095,-1.935 13.095,-3.16 -2.53,-3.16
Top Assy:
  lines w0.254: 13.07,-1.94 -1.26,-1.94 -1.26,4.46 31.76,4.46 31.76,-1.94 17.47,-1.94 ; 17.545,-3.14 33.03,-3.14 33.03,5.66 -2.53,5.66 -2.53,-3.14 25.67,-3.14 ; 13.07,-3.135 17.52,-3.135 17.52,-1.96 13.07,-1.96 13.07,-3.135
Mechanical 13:
  lines w0.1: 1.27,5.69 29.445,5.69 ; 13.12,-3.21 13.12,-2.01 ; 17.47,-3.21 17.47,-2.035 ; -2.53,-3.135 33.03,-3.135 33.03,5.66 -2.53,5.66 -2.53,-3.135 ; -2.5,-3.125 -2.5,5.6 33.025,5.6 33.025,-3.125 -2.5,-3.125
Mechanical 15:
  lines w0.05: -3.8,-3.685 -3.8,6.365 34.3,6.365 34.3,-3.685 -3.8,-3.685
3D body: height 2.8, standoff 0.1, extent -2.5,-3.125 33.025,5.655
3D body: height 8.8, standoff 0.1, extent -2.53,-3.125 -1.275,5.66
3D body: height 8.8, standoff 0.1, extent -2.53,-3.21 13.12,-2
3D body: height 8.8, standoff 0.1, extent 17.47,-3.135 33.03,-2.025
3D body: height 8.8, standoff 0.1, extent 31.75,-3.135 33,5.66
3D body: height 8.8, standoff 0.1, extent -2.5,4.5 33.025,5.6

## IDC-40_SMD [mm]
pads (40):
  rrect50% 1x4.4 smd: 1(-24.13,-3.175) 2(-24.13,3.175) 3(-21.59,-3.175) 4(-21.59,3.175) 5(-19.05,-3.175) 6(-19.05,3.175) 7(-16.51,-3.175) 8(-16.51,3.175) 9(-13.97,-3.175) 10(-13.97,3.175) 11(-11.43,-3.175) 12(-11.43,3.175) 13(-8.89,-3.175) 14(-8.89,3.175) 15(-6.35,-3.175) 16(-6.35,3.175) 17(-3.81,-3.175) 18(-3.81,3.175) 19(-1.27,-3.175) 20(-1.27,3.175) 21(1.27,-3.175) 22(1.27,3.175) 23(3.81,-3.175) 24(3.81,3.175) 25(6.35,-3.175) 26(6.35,3.175) 27(8.89,-3.175) 28(8.89,3.175) 29(11.43,-3.175) 30(11.43,3.175) 31(13.97,-3.175) 32(13.97,3.175) 33(16.51,-3.175) 34(16.51,3.175) 35(19.05,-3.175) 36(19.05,3.175) 37(21.59,-3.175) 38(21.59,3.175) 39(24.13,-3.175) 40(24.13,3.175)
Top Overlay:
  lines w0.254: -26.035,-4.445 -29.21,-4.445 -29.21,4.445 -26.035,4.445 ; 26.035,-4.445 29.21,-4.445 29.21,4.445 26.035,4.445 ; -28.575,-3.81 -26.035,-3.81 -27.305,-1.27 -28.575,-3.81
Top Assy:
  lines w0.254: -2.54,-4.445 -2.54,-3.81 ; 2.54,-4.445 2.54,-3.81 ; -29.21,-4.445 29.21,-4.445 29.21,4.445 -29.21,4.445 -29.21,-4.445 ; -28.575,-3.81 28.575,-3.81 28.575,3.81 -28.575,3.81 -28.575,-3.81
3D body: height 10.2, standoff 1.6, extent -29.21,-4.445 29.21,4.445

## IDC-40M [mm]
height 9.05
pads (40):
  rect 1.7x1.7 hole 1: 1(-0.01,0.01)
  round 1.7 hole 1: 2(-0.01,2.55) 3(2.53,0.01) 4(2.53,2.55) 5(5.07,0.01) 6(5.07,2.55) 7(7.61,0.01) 8(7.61,2.55) 9(10.15,0.01) 10(10.15,2.55) 11(12.69,0.01) 12(12.69,2.55) 13(15.23,0.01) 14(15.23,2.55) 15(17.77,0.01) 16(17.77,2.55) 17(20.31,0.01) 18(20.31,2.55) 19(22.85,0.01) 20(22.85,2.55) 21(25.39,0.01) 22(25.39,2.55) 23(27.93,0.01) 24(27.93,2.55) 25(30.47,0.01) 26(30.47,2.55) 27(33.01,0.01) 28(33.01,2.55) 29(35.55,0.01) 30(35.55,2.55) 31(38.09,0.01) 32(38.09,2.55) 33(40.63,0.01) 34(40.63,2.55) 35(43.17,0.01) 36(43.17,2.55) 37(45.71,0.01) 38(45.71,2.55) 39(48.25,0.01) 40(48.25,2.55)
Top Overlay:
  lines w0.254: 21.85,-3.15 -2.55,-3.15 -2.55,5.675 22.995,5.675 50.775,5.675 50.775,-3.1 26.35,-3.1 26.35,-1.925 ; 21.875,-3.15 21.875,-1.95 ; 21.875,-1.925 26.325,-1.925
Top Assy:
  lines w0.254: -2.55,-3.13 21.85,-3.13 ; -2.55,-3.125 -2.55,5.675 ; -2.55,5.67 50.755,5.67 50.775,5.65 50.775,-3.125 ; 21.9,-1.93 -1.35,-1.93 -1.35,4.47 49.5,4.47 49.5,-1.93 26.45,-1.93 ; 26.325,-1.95 21.85,-1.95 21.875,-1.975 21.875,-3.125 26.35,-3.125 26.35,-1.95 26.375,-1.925 ; 26.375,-3.13 50.775,-3.13
Mechanical 13:
  lines w0.1: -2.55,5.67 50.8,5.67 ; -2.55,5.675 -2.55,-3.125 50.8,-3.125 50.8,5.65 ; -2.55,5.7 50.8,5.7 ; 21.875,-3.125 21.875,-1.925 ; 26.325,-3.075 26.325,-1.9 ; -1.35,-1.95 -1.35,4.475 49.5,4.475 49.5,-1.95 -1.35,-1.95
Mechanical 15:
  lines w0.05: -3.125,-3.675 -3.125,6.375 51.4,6.375 51.4,-3.675 -3.125,-3.675
  lines w0.1: 9.65,2.55 10.65,2.55 ; 22.35,2.55 23.35,2.55 ; 37.59,2.55 38.59,2.55
3D body: height 2.8, standoff 0, extent -2.556,-3.125 50.775,5.7
3D body: height 8.8, standoff 0.25, extent -2.506,4.475 50.825,5.725
3D body: height 8.8, standoff 0.25, extent -2.531,-3.12 21.9,-1.87
3D body: height 8.8, standoff 0.25, extent -2.611,-3.081 -1.361,5.65
3D body: height 8.8, standoff 0.25, extent 49.52,-3.031 50.77,5.67
3D body: height 8.8, standoff 0.25, extent 26.294,-3.145 50.725,-1.895

## IDC-40MR [mm]
height 8.75
pads (40):
  rect 1.7x1.7 hole 1: 1(-22.86,-2.54)
  round 1.7 hole 1: 2(-22.86,0) 3(-20.32,-2.54) 4(-20.32,0) 5(-17.78,-2.54) 6(-17.78,0) 7(-15.24,-2.54) 8(-15.24,0) 9(-12.7,-2.54) 10(-12.7,0) 11(-10.16,-2.54) 12(-10.16,0) 13(-7.62,-2.54) 14(-7.62,0) 15(-5.08,-2.54) 16(-5.08,0) 17(-2.54,-2.54) 18(-2.54,0) 19(0,-2.54) 20(0,0) 21(2.54,-2.54) 22(2.54,0) 23(5.08,-2.54) 24(5.08,0) 25(7.62,-2.54) 26(7.62,0) 27(10.16,-2.54) 28(10.16,0) 29(12.7,-2.54) 30(12.7,0) 31(15.24,-2.54) 32(15.24,0) 33(17.78,-2.54) 34(17.78,0) 35(20.32,-2.54) 36(20.32,0) 37(22.86,-2.54) 38(22.86,0) 39(25.4,-2.54) 40(25.4,0)
Top Overlay:
  lines w0.254: -25.4,4.1 -25.4,2 1.27,2 27.925,2 27.925,4.1
Top Assy:
  lines w0.254: -22.865,-1.425 -22.865,2 ; -20.325,-1.425 -20.325,2 ; -17.775,-1.425 -17.775,1.95 ; -15.25,-1.425 -15.25,1.975 ; -12.725,-1.45 -12.725,1.975 ; -10.175,-1.45 -10.175,1.925 ; -7.625,-1.425 -7.625,2 ; -5.075,-1.425 -5.075,1.95 ; -2.55,-1.425 -2.55,1.975 ; -0.025,-1.45 -0.025,1.975 ; 2.525,-1.45 2.525,1.925 ; 5.05,-1.45 5.05,1.95 ; 7.625,-1.4 7.625,2.025 ; 10.15,-1.45 10.15,1.975 ; 12.69,-1.425 12.69,1.975 ; 15.215,-1.45 15.215,1.975 ; 17.765,-1.45 17.765,1.925 ; 20.29,-1.45 20.29,1.95 ; 22.865,-1.4 22.865,2.025 ; 25.39,-1.45 25.39,1.975 ; -25.4,2 27.925,2 27.925,11.1 3.525,11.1 3.5,11.075 3.5,4.1 -0.9,4.1 -0.975,4.175 -0.975,11.075 -1,11.1 -25.4,11.1 -25.4,2
Mechanical 13:
  lines w0.1: -23.04,2.025 -23.04,-2.54 -22.69,-2.54 -22.69,2.025 ; -23.025,2.025 -23.025,-2.54 -22.675,-2.54 -22.675,2.025 ; -20.5,2.025 -20.5,-2.54 -20.15,-2.54 -20.15,2.025 ; -17.95,2.057 -17.95,-2.485 -17.6,-2.475 -17.6,2.057 ; -15.425,-2.508 -15.425,2.057 ; -15.42,-2.54 -15.07,-2.54 ; -15.075,-2.508 -15.075,2.057 ; -12.9,-2.508 -12.9,2.057 ; -12.88,-2.54 -12.53,-2.54 ; -12.55,-2.508 -12.55,2.057 ; -10.34,-2.54 -9.99,-2.54 ; -10.325,2.025 -10.325,-2.54 -9.975,-2.54 ; -10,-2.533 -10,2.033 ; -7.8,2.025 -7.8,-2.54 -7.45,-2.54 -7.45,2.025 ; -5.25,2.057 -5.25,-2.485 -4.9,-2.475 -4.9,2.057 ; -2.725,-2.508 -2.725,2.057 ; -2.72,-2.54 -2.37,-2.54 ; -2.375,-2.508 -2.375,2.057 ; -0.2,-2.508 -0.2,2.057 ; -0.18,-2.54 0.17,-2.54 ; 0.15,-2.508 0.15,2.057 ; 2.35,-2.533 2.35,2.033 ; 2.36,-2.54 2.71,-2.54 ; 2.7,-2.533 2.7,2.033 ; 4.875,-2.533 4.875,2.033 ; 4.9,-2.54 5.25,-2.54 ; 5.225,-2.533 5.225,2.033 ; 7.44,-2.54 7.79,-2.54 ; 7.45,-2.533 7.45,2.033 ; 7.8,-2.533 7.8,2.033 ; 9.975,2 9.975,-2.565 10.325,-2.565 10.325,2 ; 12.52,-2.54 12.87,-2.54 ; 12.525,2.025 12.525,-2.54 12.875,-2.54 12.875,2.025 ; 15.04,-2.508 15.04,2.057 ; 15.06,-2.54 15.41,-2.54 ; 15.39,-2.508 15.39,2.057 ; 17.59,-2.533 17.59,2.033 ; 17.6,-2.54 17.95,-2.54 ; 17.94,-2.533 17.94,2.033 ; 20.115,-2.533 20.115,2.033 ; 20.14,-2.54 20.49,-2.54 ; 20.465,-2.533 20.465,2.033 ; 22.68,-2.54 23.03,-2.54 ; 22.69,-2.533 22.69,2.033 ; 23.04,-2.533 23.04,2.033 ; 25.215,2 25.215,-2.565 25.565,-2.565 25.565,2 ; -25.4,1.95 27.95,1.95 27.95,11.1 -25.4,11.1 -25.4,1.95
Mechanical 15:
  lines w0.05: -25.9,-3.775 -25.9,11.525 28.275,11.525 28.275,-3.775 -25.9,-3.775
  lines w0.1: -13.2,0 -12.2,0 ; -12.7,-0.5 -12.7,0.5 ; -0.5,0 0.5,0 ; 0,-0.5 0,0.5 ; 14.74,0 15.74,0 ; 15.24,-0.5 15.24,0.5
3D body: height 9, standoff 0, extent -25.402,2.025 27.925,11.125
3D body: height 5.8, standoff 0, extent -7.826,-2.54 -7.45,2.075
3D body: height 5.8, standoff 0, extent -5.276,-2.54 -4.9,2.075
3D body: height 5.8, standoff 0, extent -2.751,-2.54 -2.375,2.075
3D body: height 5.8, standoff 0, extent -0.226,-2.54 0.15,2.075
3D body: height 5.8, standoff 0, extent 2.324,-2.54 2.7,2.075
3D body: height 5.8, standoff 0, extent 4.849,-2.54 5.225,2.075
3D body: height 5.8, standoff 0, extent 7.424,-2.54 7.8,2.075
3D body: height 5.8, standoff 0, extent 9.949,-2.565 10.325,2.05
3D body: height 5.8, standoff 0, extent 12.499,-2.54 12.875,2.075
3D body: height 5.8, standoff 0, extent -10.376,-2.54 -10,2.075
3D body: height 5.8, standoff 0, extent -12.926,-2.54 -12.55,2.075
3D body: height 5.8, standoff 0, extent -15.451,-2.54 -15.075,2.075
3D body: height 5.8, standoff 0, extent -17.976,-2.54 -17.6,2.075
3D body: height 5.8, standoff 0, extent -20.526,-2.54 -20.15,2.075
3D body: height 5.8, standoff 0, extent -23.066,-2.54 -22.69,2.075
3D body: height 5.8, standoff 0, extent 25.189,-2.565 25.565,2.05
3D body: height 5.8, standoff 0, extent 22.664,-2.54 23.04,2.075
3D body: height 5.8, standoff 0, extent 20.089,-2.54 20.465,2.075
3D body: height 5.8, standoff 0, extent 17.564,-2.54 17.94,2.075
3D body: height 5.8, standoff 0, extent 15.014,-2.54 15.39,2.075

## IDC-50M [mm]
height 9.05
pads (50):
  rect 1.7x1.7 hole 1: 1(-0.01,0.01)
  round 1.7 hole 1: 2(-0.01,2.55) 3(2.53,0.01) 4(2.53,2.55) 5(5.07,0.01) 6(5.07,2.55) 7(7.61,0.01) 8(7.61,2.55) 9(10.15,0.01) 10(10.15,2.55) 11(12.69,0.01) 12(12.69,2.55) 13(15.23,0.01) 14(15.23,2.55) 15(17.77,0.01) 16(17.77,2.55) 17(20.31,0.01) 18(20.31,2.55) 19(22.85,0.01) 20(22.85,2.55) 21(25.39,0.01) 22(25.39,2.55) 23(27.93,0.01) 24(27.93,2.55) 25(30.47,0.01) 26(30.47,2.55) 27(33.01,0.01) 28(33.01,2.55) 29(35.55,0.01) 30(35.55,2.55) 31(38.09,0.01) 32(38.09,2.55) 33(40.63,0.01) 34(40.63,2.55) 35(43.17,0.01) 36(43.17,2.55) 37(45.71,0.01) 38(45.71,2.55) 39(48.25,0.01) 40(48.25,2.55) 41(50.8,0) 42(50.8,2.54) 43(53.34,0) 44(53.34,2.54) 45(55.88,0) 46(55.88,2.54) 47(58.42,0) 48(58.42,2.54) 49(60.96,0) 50(60.96,2.54)
Top Overlay:
  lines w0.254: -2.55,-3.15 28.475,-3.15 28.475,-1.925 32.35,-1.925 32.35,-3.1 63.5,-3.1 63.5,5.675 22.995,5.675 -2.55,5.675 -2.55,-3.15
Top Assy:
  lines w0.254: -2.55,-3.13 21.85,-3.13 ; -2.55,-3.125 -2.55,5.675 ; -2.55,5.67 63.5,5.67 63.5,-3.13 26.375,-3.13 ; 28.55,-1.93 -1.35,-1.93 -1.35,4.47 62.225,4.47 62.225,-1.93 32.375,-1.93 ; 28.475,-3.125 28.475,-1.95 32.35,-1.95 32.35,-3.125 28.475,-3.125
Mechanical 13:
  lines w0.1: -2.55,5.67 63.5,5.67 63.5,-3.125 -2.55,-3.125 -2.55,5.675 ; -2.55,5.7 50.8,5.7 ; 28.5,-3.225 28.5,-2.025 ; 32.325,-3.15 32.325,-1.975 ; -1.35,-1.95 62.2,-1.95 62.2,4.475 -1.35,4.475 -1.35,-1.95
Mechanical 15:
  lines w0.05: -3.125,-3.675 64.125,-3.675 64.125,6.375 -3.125,6.375 -3.125,-3.675
  lines w0.1: 9.65,2.55 10.65,2.55 ; 22.35,2.55 23.35,2.55 ; 37.59,2.55 38.59,2.55 ; 50.3,2.54 51.3,2.54
3D body: height 8.8, standoff 0.25, extent 32.35,-3.145 63.5,-1.895
3D body: height 8.8, standoff 0.25, extent 62.22,-3.031 63.47,5.67
3D body: height 8.8, standoff 0.25, extent -2.611,-3.081 -1.361,5.65
3D body: height 8.8, standoff 0.25, extent -2.531,-3.12 28.475,-1.87
3D body: height 8.8, standoff 0.25, extent -2.506,4.475 63.5,5.725
3D body: height 2.8, standoff 0, extent -2.556,-3.125 63.5,5.7